# Altium footprint library Mi Libreria.PcbLib: 184 footprints (part 5 of 12)
Each footprint in its own frame and in the unit in brackets; x right, y up, seen from the top. Pads: shape width x height; smd on the part's side, far side on the other; paste and mask are expansions set on the pad; w line width, h text height; cw(c..) or ccw(c..) is an arc to the next point about the centre after c.
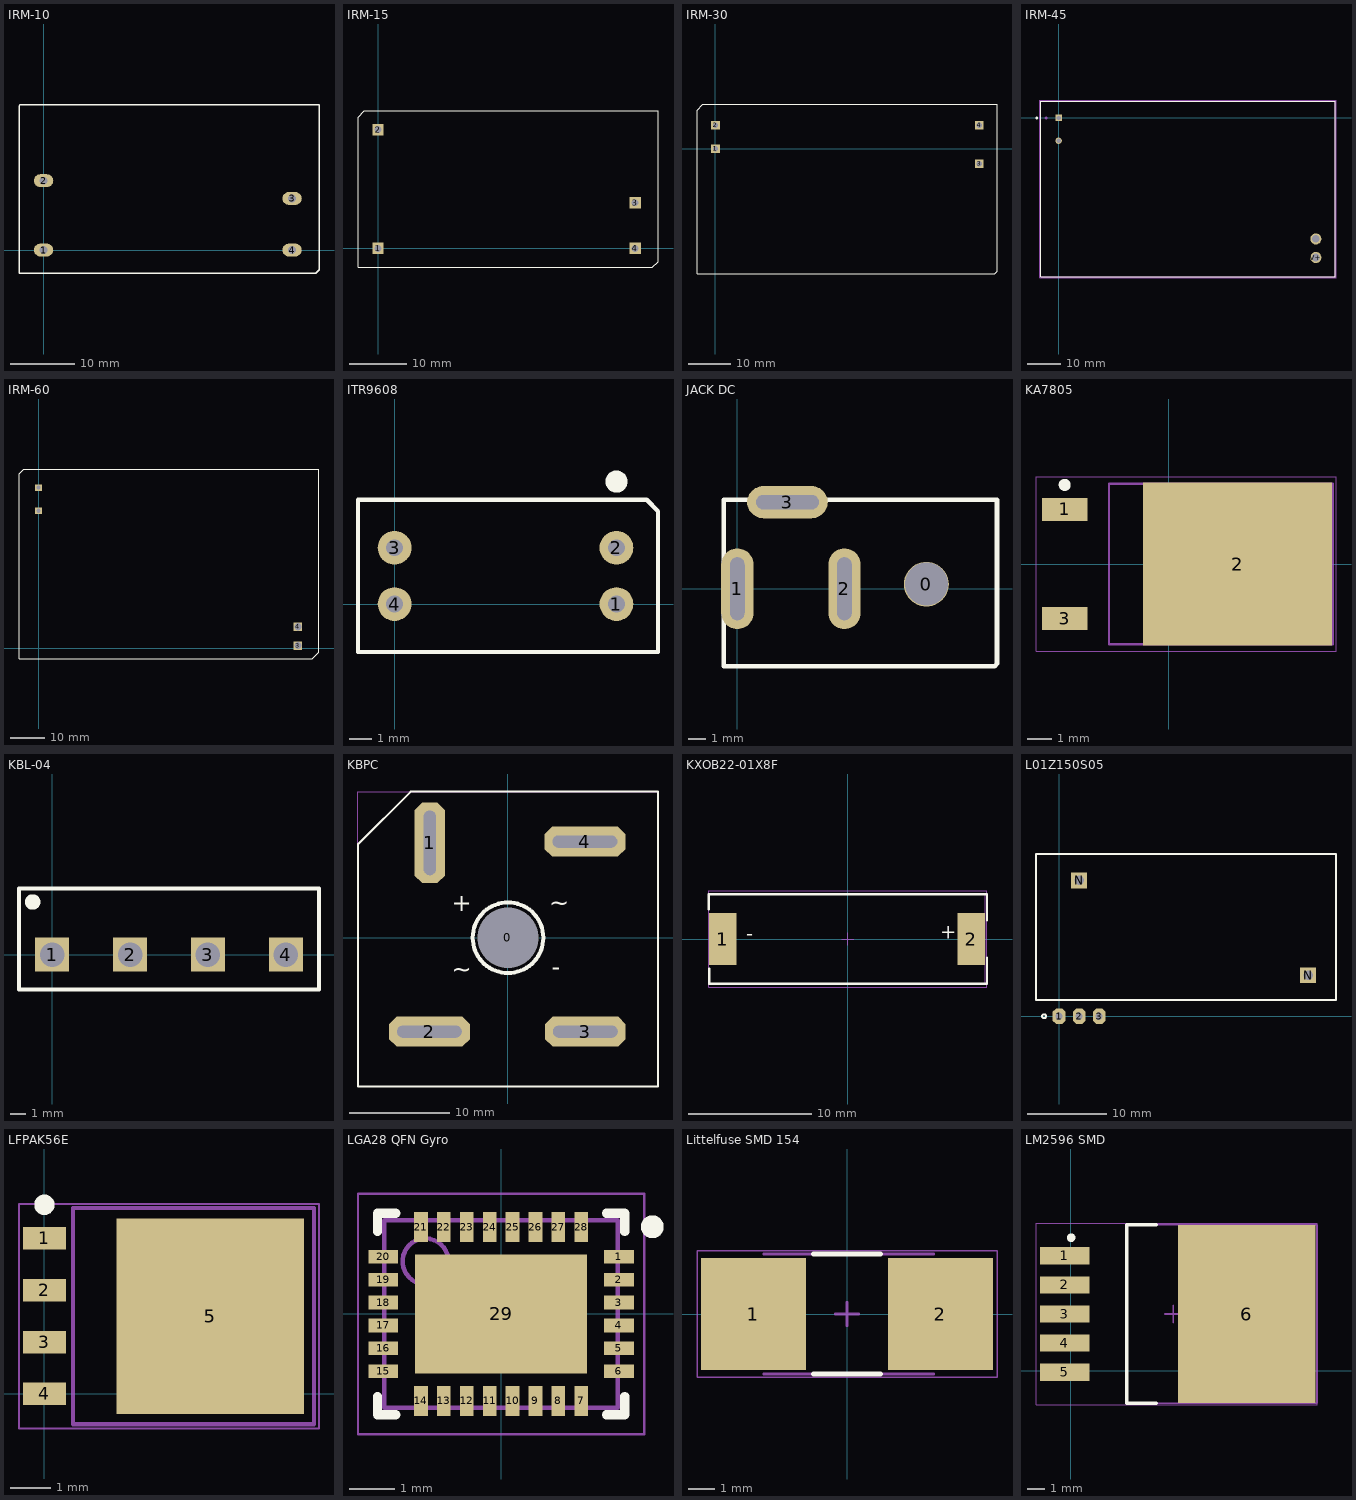
[diagram p4: the footprints below, top view; thin cyan lines are the x and y axes]

## IRM-10 [mm] "Power Supply AC-DC 10W"
pads (4):
  oval 3x2 hole 1.2: 1(0,0) 2(0,10.75) 3(38.5,8) 4(38.5,0)
Top Overlay:
  lines w0.2: -3.81,-3.556 -3.81,22.352 -3.683,22.479 42.672,22.479 42.672,-3.048 42.164,-3.556 -3.81,-3.556
3D body "IRM-10-xx.step": height 22.55, standoff -3, extent -3.5,-3.3 42.199,22.1

## IRM-15 [mm] "Power Supply AC-DC 15W"
pads (4):
  rect 2x2 hole 1.2: 1(0,0) 2(0,20.8) 3(45,8) 4(45,0)
Top Overlay:
  lines w0.2: -3.5,-3.3 -3.5,23 -2.4,24.1 49,24.1 49,-2.3 48,-3.3 -3.5,-3.3
3D body: height 3, standoff -2, extent -0.446,-0.449 0.45,0.449
3D body: height 3, standoff -2, extent 44.554,7.551 45.45,8.449
3D body: height 3, standoff -2, extent 44.554,-0.449 45.45,0.449
3D body: height 3, standoff -2, extent -0.446,20.351 0.45,21.249
3D body: height 24, standoff 0.25, extent -2.921,-2.794 48.26,23.749

## IRM-30 [mm] "Power Supply AC-DC 30W"
pads (4):
  rect 2x2 hole 1.2: 1(0,0) 2(0,5.5) 3(61.627,-3.5) 4(61.627,5.5)
Top Overlay:
  lines w0.2: -4.318,-29.21 65.278,-29.21 65.786,-28.702 65.786,10.414 -2.921,10.414 -4.318,9.017 -4.318,-29.21
3D body "IRM-30.step": height 24, standoff -3.5, extent -4.016,-28.898 65.484,10.102
3D body: height 24, standoff 22, extent -1.27,-27.178 62.611,8.001

## IRM-45 [mm] "Power Supply AC-DC 45W"
pads (4):
  rect 1.881x1.881 hole 1.254: AC/L(0,0)
  round 1.881 hole 1.254: AC/N(0,-6.75)
  round 3.27 hole 2.254: GND(76,-35.75) V+(76,-41.25)
Top Overlay:
  circle w0.4: c-6.49,0 r0.2
  lines w0.127: -5.3,-47 -5.3,5 81.7,5 81.7,-47 -5.3,-47
Mechanical 13:
  circle w0.4: c-3.69,0 r0.2
  lines w0.127: -5.3,-47 -5.3,5 81.7,5 81.7,-47 -5.3,-47
Mechanical 15:
  lines w0.05: -5.55,-47.25 -5.55,5.25 81.95,5.25 81.95,-47.25 -5.55,-47.25
3D body: height 29.65, standoff 0, extent -5.08,-46.863 81.534,4.826
3D body: height 1, standoff -2, extent -0.546,-0.549 0.55,0.549
3D body: height 1, standoff -2, extent -0.545,-7.299 0.55,-6.201
3D body: height 1, standoff -2, extent 75.206,-36.548 76.8,-34.951
3D body: height 1, standoff -2, extent 75.206,-42.048 76.8,-40.451

## IRM-60 [mm] "AC-DC Converter"
pads (4):
  rect 2x2 hole 1.2: 1(0,40.25) 2(0,47)
  rect 2.5x2.5 hole 2.1: 3(76,0.75) 4(76,6.25)
Top Overlay:
  lines w0.2: -5.715,-3.175 -5.715,51.054 -4.318,52.451 82.169,52.451 82.169,-1.27 80.264,-3.175 -5.715,-3.175
3D body: height 3, standoff -2, extent -0.446,39.791 0.45,40.689
3D body: height 3, standoff -2, extent 75.256,5.502 76.75,6.999
3D body: height 3, standoff -2, extent 75.256,0.002 76.75,1.499
3D body: height 3, standoff -2, extent -0.446,46.551 0.45,47.449
3D body: height 30, standoff 0.25, extent -5.334,-2.794 81.788,52.07

## ITR9608 [mil] "Photo Interrupter"
pads (4):
  round 60 hole 30: 1(393.7,0) 2(393.7,100) 3(0,100) 4(0,0)
Top Overlay:
  circle w19.68: c393.7,217.5 r9.84
  lines w7.87: -65,-85 467.5,-85 467.5,165 447.5,185 -65,185 -65,-85
3D body "ITR9608.STEP": height 393.7, standoff -236.22, extent -55.9,-68.11 455.91,168.11

## JACK DC [mm] "2.5mm TH"
pads (4):
  round 2.5 hole 2.4: 0(10.541,0.254)
  oval 1.8x4.5 hole 0.8 slot 3.5 at 90 deg: 1(0,0) 2(5.969,0)
  oval 4.5x1.8 hole 0.8 slot 3.5 at 0 deg: 3(2.794,4.826)
Top Overlay:
  lines w0.254: -0.762,-4.318 -0.762,4.953 14.478,4.953 14.478,-4.191 14.351,-4.318 -0.762,-4.318
3D body "JACK DC.STEP": height 11.5, standoff -3, extent -0.792,-4.318 14.508,5.038

## KA7805 [mm] "D-PAK, 3-Pads, Body 6.20x6.72mm (max), IPC Medium Density"
height 2.38
pads (3):
  rect 1.9x0.95 smd: 1(-4.35,2.28) 3(-4.35,-2.28)
  rect 7.9x6.8 smd: 2(2.874,0)
Top Overlay:
  circle w0.25: c-4.35,3.305 r0.125
Mechanical 13:
  lines w0.1: -2.5,-3.35 6.858,-3.35 6.858,3.35 -2.5,3.35 -2.5,-3.35
Mechanical 15:
  lines w0.05: -5.55,-3.65 6.985,-3.65 6.985,3.65 -5.55,3.65 -5.55,-3.65
  lines w0.1: -0.5,0 0.5,0 ; 0,-0.5 0,0.5
3D body "DPAK.STEP": height 2.39, standoff -0.02, extent -4.668,-3.27 5.27,3.27

## KBL-04 [mm] "KBL PUENTE DE DIODOS"
pads (4):
  rect 2.2x2.2 hole 1.6: 1(0,0) 2(5.08,0) 3(10.16,0) 4(15.24,0)
Top Overlay:
  circle w0.5: c-1.27,3.429 r0.254
  lines w0.254: -2.159,-2.286 17.399,-2.286 17.399,4.318 -2.159,4.318 -2.159,-2.286
3D body "KBL.STEP": height 17.32, standoff -2, extent -2.13,-2.227 17.37,4.273

## KBPC [mm]
pads (5):
  round 1.524 hole 6: 0(0,0)
  oct 3x8 hole 1.2 slot 6.4 at 90 deg: 1(-7.747,9.398)
  oct 8x3 hole 1.2 slot 6.4 at 0 deg: 2(-7.788,-9.3) 3(7.661,-9.3) 4(7.62,9.525)
Top Overlay:
  circle w0.4: c0,0 r3.5
  lines w0.2: -14.859,-14.732 -14.859,9.271 -9.652,14.478 14.859,14.478 14.859,-14.732 -14.859,-14.732
  text "+" at -5.588,2.032 h3
  text "-" at 4.318,-4.318 h3
  text "~" at 4.064,2.032 h3
  text "~" at -5.588,-4.572 h3
Mechanical 13:
  lines w0.1: -14.859,-14.732 -14.859,14.478 14.859,14.478 14.859,-14.732 -14.859,-14.732
3D body "Fairchild Bridge Rectifier GBPC2504.STEP": height 20.03, standoff -4.5, extent -14.478,-14.377 14.522,14.123

## KXOB22-01X8F [mm] "Solar Cell 22x7mm"
pads (2):
  rect 2.25x4.2 smd: 1(-10.143,0) 2(10.016,0)
Top Overlay:
  lines w0.2: -11.303,2.413 -11.303,3.65 11.303,3.65 11.303,1.525 ; -11.262,-2.413 -11.262,-3.65 11.303,-3.65 11.303,-1.525
  text "-" at -8.255,-0.508 h2
  text "+" at 7.493,-0.381 h2
Mechanical 13:
  lines w0.1: -11.303,-3.65 11.176,-3.65 11.176,3.65 -11.303,3.65 -11.303,-3.65
Mechanical 15:
  lines w0.05: -11.303,-3.9 11.303,-3.9 11.303,3.9 -11.303,3.9 -11.303,-3.9
  lines w0.1: -0.5,0 0.5,0 ; 0,-0.5 0,0.5
3D body: height 1, standoff 0, extent -10.668,-3.302 10.795,3.175

## L01Z150S05 [mm] "Current Sensor"
pads (5):
  oct 1.6x2 hole 0.9: 1(0,0) 2(2.54,0) 3(5.08,0)
  rect 2x2 hole 1.2: N(2.54,17.2) N(31.54,5.2)
Top Overlay:
  circle w0.25: c-1.905,0 r0.254
  lines w0.254: -2.921,2.032 -2.921,20.572 35.079,20.572 35.079,2.032 -2.921,2.032
Mechanical 15:
  lines w0.1: 2.04,0 3.04,0 ; 2.54,-0.5 2.54,0.5
3D body: height 3.5, standoff 3, extent 4.783,-0.299 5.38,2.667
3D body: height 3.5, standoff 3, extent 2.243,-0.299 2.84,2.667
3D body: height 3.5, standoff 3, extent -0.297,-0.299 0.3,2.667
3D body: height 27, standoff 0, extent -2.54,2.413 13.335,20.193
3D body: height 27, standoff 0, extent 26.035,2.413 34.671,20.193
3D body: height 27.5, standoff 17.5, extent -2.54,2.413 34.671,20.193
3D body: height 9.5, standoff 0, extent -2.54,2.413 34.671,20.193
3D body: height 3, standoff -1, extent 31.094,4.751 31.99,5.649
3D body: height 3, standoff -1, extent 2.094,16.751 2.99,17.649
3D body: height 3, standoff -1, extent 4.783,-0.299 5.38,0.3
3D body: height 3, standoff -1, extent 2.243,-0.299 2.84,0.3
3D body: height 3, standoff -1, extent -0.297,-0.299 0.3,0.3

## LFPAK56E [mm] "NXP LFPAK56E Plastic single-ended surface-mounted package"
pads (5):
  rect 1.05x0.55 smd: 1(0,3.81) 2(0,2.54) 3(0,1.27) 4(0,0)
  rect 4.6x4.8 smd: 5(4.064,1.905)
Top Overlay:
  circle w0.25: c0,4.635 r0.125
Mechanical 13:
  lines w0.1: 0.7,-0.745 6.604,-0.745 6.604,4.555 0.7,4.555 0.7,-0.745
Mechanical 15:
  lines w0.05: -0.625,-0.845 6.731,-0.845 6.731,4.655 -0.625,4.655 -0.625,-0.845
  lines w0.1: 2.531,1.905 3.531,1.905 ; 3.031,1.405 3.031,2.405
3D body "LFPAK.step": height 1.1, standoff 0, extent -0.204,-0.545 5.796,4.355

## LGA28 QFN Gyro [mm] "QFN, 28-Leads, Body 5.00x3.50mm, Pitch 0.50mm, Thermal Pad 3.75x2.75mm, IPC Medium Density"
height 1
pads (29):
  rect 0.65x0.3 smd: 1(2.575,1.25) 2(2.575,0.75) 3(2.575,0.25) 4(2.575,-0.25) 5(2.575,-0.75) 6(2.575,-1.25) 15(-2.575,-1.25) 16(-2.575,-0.75) 17(-2.575,-0.25) 18(-2.575,0.25) 19(-2.575,0.75) 20(-2.575,1.25)
  rect 0.3x0.65 smd: 7(1.75,-1.9) 8(1.25,-1.9) 9(0.75,-1.9) 10(0.25,-1.9) 11(-0.25,-1.9) 12(-0.75,-1.9) 13(-1.25,-1.9) 14(-1.75,-1.9) 21(-1.75,1.9) 22(-1.25,1.9) 23(-0.75,1.9) 24(-0.25,1.9) 25(0.25,1.9) 26(0.75,1.9) 27(1.25,1.9) 28(1.75,1.9)
  rect 3.75x2.6 smd: 29(0,0)
Top Overlay:
  circle w0.25: c3.302,1.905 r0.125
  lines w0.2: -2.7,-1.8 -2.7,-2.2 -2.3,-2.2 ; -2.7,1.8 -2.7,2.2 -2.3,2.2 ; 2.3,-2.2 2.7,-2.2 2.7,-1.8 ; 2.3,2.2 2.7,2.2 2.7,1.8
Mechanical 13:
  circle w0.1: c-1.65,1.15 r0.5
  lines w0.1: -2.55,-2.05 -2.55,2.05 2.55,2.05 2.55,-2.05 -2.55,-2.05
Mechanical 15:
  lines w0.05: -3.125,-2.625 -3.125,2.625 3.125,2.625 3.125,-2.625 -3.125,-2.625
  lines w0.1: -0.5,0 0.5,0 ; 0,-0.5 0,0.5
3D body: height 1, standoff 0.01, extent -2.55,-2.05 2.55,2.05

## Littelfuse SMD 154 [mm]
pads (2):
  rect 4x4.25 smd: 1(-3.567,0) 2(3.556,0)
Top Overlay:
  lines w0.2: -1.27,-2.286 1.27,-2.286 ; -1.27,2.286 1.27,2.286
Mechanical 13:
  lines w0.1: -3.175,-2.286 3.302,-2.286 ; -3.175,2.286 3.302,2.286
Mechanical 15:
  lines w0.05: -5.715,-2.413 -5.715,2.413 5.715,2.413 5.715,-2.413 -5.715,-2.413
  lines w0.1: -0.45,0 0.45,0 ; 0,-0.45 0,0.45
3D body "OMNI-BLOK littelfuse.step": height 3.81, standoff 0, extent -4.915,-2.515 4.915,2.515

## LM2596 SMD [mm] "Regulador Switcheo SMD DPAK"
pads (6):
  rect 2.9x1 smd: 1(-0.362,6.702) 2(-0.362,5.002) 3(-0.362,3.302) 4(-0.362,1.602) 5(-0.362,-0.098)
  rect 8x10.4 smd: 6(10.258,3.302)
Top Overlay:
  circle w0.25: c0.019,7.752 r0.125
  lines w0.2: 4.969,-1.898 3.269,-1.898 3.269,8.502 4.969,8.502
Mechanical 13:
  lines w0.1: 3.269,-1.898 14.351,-1.898 14.351,8.502 3.269,8.502 3.269,-1.898
Mechanical 15:
  lines w0.05: -2.032,-1.998 14.351,-1.998 14.351,8.602 -2.032,8.602 -2.032,-1.998
  lines w0.1: 5.469,3.302 6.469,3.302 ; 5.969,2.802 5.969,3.802
3D body "TO-263 5Ld.step": height 4.57, standoff -0.01, extent -1.224,-1.778 13.416,8.382